# Altium footprint library NASCO 3D PCBLIB.PcbLib: 108 footprints (part 6 of 7)
Each footprint in its own frame and in the unit in brackets; x right, y up, seen from the top. Pads: shape width x height; smd on the part's side, far side on the other; paste and mask are expansions set on the pad; w line width, h text height; cw(c..) or ccw(c..) is an arc to the next point about the centre after c.
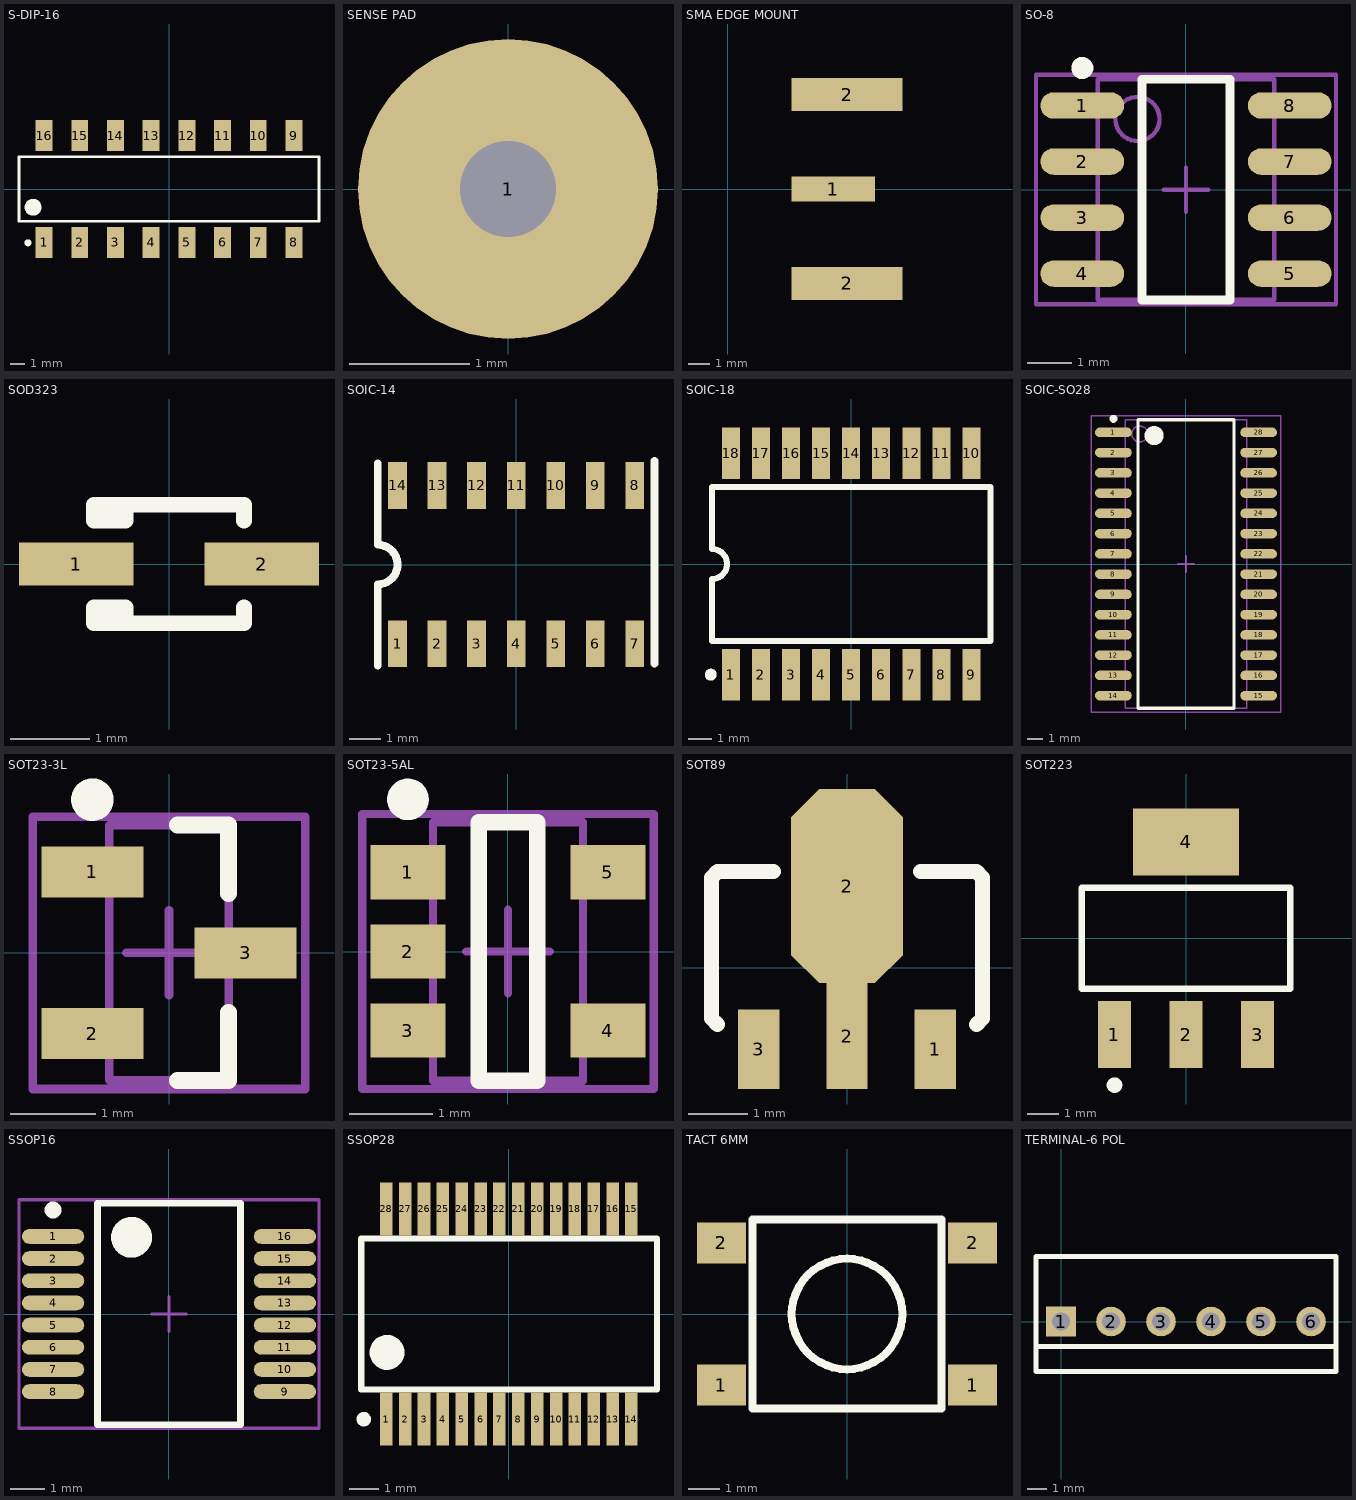
[diagram p5: the footprints below, top view; thin cyan lines are the x and y axes]

## S-DIP-16 [mm] "DIP; 16 Trim Leads; Row Spacing 7.62 mm; Pitch 2.54 mm"
height 5.58
pads (16):
  rect 1.2x2.2 smd: 1(-8.89,-3.8) 2(-6.35,-3.8) 3(-3.81,-3.8) 4(-1.27,-3.8) 5(1.27,-3.8) 6(3.81,-3.8) 7(6.35,-3.8) 8(8.89,-3.8) 9(8.89,3.8) 10(6.35,3.8) 11(3.81,3.8) 12(1.27,3.8) 13(-1.27,3.8) 14(-3.81,3.8) 15(-6.35,3.8) 16(-8.89,3.8)
Top Overlay:
  circle w0.6: c-9.675,-1.3 r0.3
  circle w0.25: c-10.04,-3.827 r0.125
  lines w0.2: -10.675,-2.3 -10.675,2.3 10.675,2.3 10.675,-2.3 -10.675,-2.3
3D body: height 4.4, standoff 0, extent -10.75,-4 10.75,4
3D body: height 5, standoff 0, extent -9.5,-1.75 -8.25,0
3D body: height 5, standoff 0, extent -6.96,-1.75 -5.71,0
3D body: height 5, standoff 0, extent -4.42,-1.75 -3.17,0
3D body: height 5, standoff 0, extent -1.88,-1.75 -0.63,0
3D body: height 5, standoff 0, extent 0.66,-1.75 1.91,0
3D body: height 5, standoff 0, extent 3.2,-1.75 4.45,0
3D body: height 5, standoff 0, extent 5.74,-1.75 6.99,0
3D body: height 5, standoff 0, extent 8.28,-1.75 9.53,0
3D body: height 4.41, standoff 0, extent -9.5,0 -8.25,1.5
3D body: height 4.41, standoff 0, extent -6.96,0 -5.71,1.5
3D body: height 4.41, standoff 0, extent -4.42,0 -3.17,1.5
3D body: height 4.41, standoff 0, extent -1.88,0 -0.63,1.5
3D body: height 4.41, standoff 0, extent 0.66,0 1.91,1.5
3D body: height 4.41, standoff 0, extent 3.2,0 4.45,1.5
3D body: height 4.41, standoff 0, extent 5.74,0 6.99,1.5
3D body: height 4.41, standoff 0, extent 8.28,0 9.53,1.5

## SENSE PAD [mm]
height 3.9
pads (1):
  round 2.5 hole 0.8 unplated: 1(0,0)

## SMA EDGE MOUNT [mil]
pads (3):
  rect 150x45 smd: 1(190,0)
  rect 200x60 smd: 2(215,-170) 2(215,170)
3D body "User Library-SMA_142-0701-851.step": height 161.23, standoff -150.58, extent -244.49,-187.4 300,187.4

## SO-8 [mm] "SOIC, 8-Leads, Body 4.9x3.9mm, Pitch 1.27mm, IPC High Density"
height 1.75
pads (8):
  oval 1.9x0.6 smd: 1(-2.35,1.905) 2(-2.35,0.635) 3(-2.35,-0.635) 4(-2.35,-1.905) 5(2.35,-1.905) 6(2.35,-0.635) 7(2.35,0.635) 8(2.35,1.905)
Top Overlay:
  circle w0.25: c-2.35,2.755 r0.125
  lines w0.2: -1,-2.5 -1,2.5 1,2.5 1,-2.5 -1,-2.5
Mechanical 13:
  circle w0.1: c-1.1,1.6 r0.5
  lines w0.1: -2,-2.5 -2,2.5 2,2.5 2,-2.5 -2,-2.5
Mechanical 15:
  lines w0.1: -0.5,0 0.5,0 ; 0,-0.5 0,0.5 ; -3.4,-2.6 -3.4,2.6 3.4,2.6 3.4,-2.6 -3.4,-2.6
3D body "User Library-SOIC-8-1.STEP": height 1.75, standoff 0, extent -2.9,-2.45 3.1,2.45

## SOD323 [mm] "SOD-323/SC-76; 2 Leads; Body 1.7 x 1.3 mm, (LxW)"
height 1.1
pads (2):
  rect 1.45x0.55 smd: 1(-1.175,0) 2(1.175,0)
Top Overlay:
  lines w0.2: -0.55,-0.75 -0.55,-0.55 -0.95,-0.55 -0.95,-0.75 0.95,-0.75 0.95,-0.55 ; -0.55,0.75 -0.55,0.55 -0.95,0.55 -0.95,0.75 0.95,0.75 0.95,0.55
3D body "User Library-SOD323.step": height 1.01, standoff 0.02, extent -1.25,-0.635 1.25,0.615

## SOIC-14 [mm] "SOIC-14  NARROW BODY"
pads (14):
  rect 0.6x1.5 smd: 1(-3.81,-2.54) 2(-2.54,-2.54) 3(-1.27,-2.54) 4(0,-2.54) 5(1.27,-2.54) 6(2.54,-2.54) 7(3.81,-2.54) 8(3.81,2.54) 9(2.54,2.54) 10(1.27,2.54) 11(0,2.54) 12(-1.27,2.54) 13(-2.54,2.54) 14(-3.81,2.54)
Top Overlay:
  lines w0.254: -4.445,-3.25 -4.445,-0.635 ccw(c-4.445,0) -4.445,0.635 -4.445,3.25 ; 4.445,-3.175 4.445,3.325
3D body "User Library-SOIC-14.step": height 1.75, standoff 0, extent -4.375,-3 4.375,3

## SOIC-18 [mil]
pads (18):
  rect 30x85 smd: 1(-200,-184.05) 2(-150,-184.05) 3(-100,-184.05) 4(-50,-184.05) 5(0,-184.05) 6(50,-184.05) 7(100,-184.05) 8(150,-184.05) 9(200,-184.05) 10(200,184.06) 11(150,184.06) 12(100,184.06) 13(50,184.06) 14(0,184.06) 15(-50,184.06) 16(-100,184.06) 17(-150,184.06) 18(-200,184.06)
Top Overlay:
  circle w10: c-233.46,-184.06 r4.92
  lines w10: -231.3,-127.95 -231.3,-25 ccw(c-231.3,0) -231.3,25 -231.3,127.95 231.3,127.95 231.3,-127.95 -231.3,-127.95
3D body: height 98.43, standoff 0, extent -236.22,-147.64 236.22,147.64
3D body: height 100.39, standoff 98.43, extent -196.85,-108.27 -157.64,-68.98

## SOIC-SO28 [mm] "SOIC, 28-Leads, Body 17.9x7.5mm, Pitch 1.27mm, IPC Medium Density"
height 2.65
pads (28):
  oval 2.3x0.6 smd: 1(-4.55,8.255) 2(-4.55,6.985) 3(-4.55,5.715) 4(-4.55,4.445) 5(-4.55,3.175) 6(-4.55,1.905) 7(-4.55,0.635) 8(-4.55,-0.635) 9(-4.55,-1.905) 10(-4.55,-3.175) 11(-4.55,-4.445) 12(-4.55,-5.715) 13(-4.55,-6.985) 14(-4.55,-8.255) 15(4.55,-8.255) 16(4.55,-6.985) 17(4.55,-5.715) 18(4.55,-4.445) 19(4.55,-3.175) 20(4.55,-1.905) 21(4.55,-0.635) 22(4.55,0.635) 23(4.55,1.905) 24(4.55,3.175) 25(4.55,4.445) 26(4.55,5.715) 27(4.55,6.985) 28(4.55,8.255)
Top Overlay:
  circle w0.25: c-4.55,9.105 r0.125
  circle w0.6: c-2,8.05 r0.3
  lines w0.2: -3,-9.05 -3,9.05 3,9.05 3,-9.05 -3,-9.05
Mechanical 13:
  circle w0.1: c-2.9,8.155 r0.5
  lines w0.1: -3.8,-9.055 -3.8,9.055 3.8,9.055 3.8,-9.055 -3.8,-9.055
Mechanical 15:
  lines w0.1: -0.5,0 0.5,0 ; 0,-0.5 0,0.5 ; -5.95,-9.3 -5.95,9.3 5.95,9.3 5.95,-9.3 -5.95,-9.3
3D body "User Library-28-SOIC.step": height 2.67, standoff -0.08, extent -5.22,-8.95 5.08,8.95

## SOT23-3L [mm] "SOT23, 3-Leads, Body 2.9x1.3mm, Pitch 0.95mm, Lead Span 2.5mm, IPC High Density"
height 1.1
pads (3):
  rect 1.2x0.6 smd: 1(-0.9,0.95) 2(-0.9,-0.95) 3(0.9,0)
Top Overlay:
  circle w0.25: c-0.9,1.8 r0.125
  lines w0.2: 0.1,-1.5 0.7,-1.5 0.7,-0.7 ; 0.1,1.5 0.7,1.5 0.7,0.7
Mechanical 13:
  lines w0.1: -0.7,-1.5 0.7,-1.5 0.7,1.5 -0.7,1.5 -0.7,-1.5
Mechanical 15:
  lines w0.1: -0.5,0 0.5,0 ; 0,-0.5 0,0.5 ; -1.6,-1.6 1.6,-1.6 1.6,1.6 -1.6,1.6 -1.6,-1.6
3D body "SW3DPS-SOT-23-DEFAULT.STEP": height 1.12, standoff 0.02, extent -1.25,-1.5 1.25,1.5

## SOT23-5AL [mm] "SOT23, 5-Leads, Body 2.9x1.6mm, Pitch 0.95mm, Lead Span 2.8mm, IPC High Density"
height 1.45
pads (5):
  rect 0.9x0.65 smd: 1(-1.2,0.95) 2(-1.2,0) 3(-1.2,-0.95) 4(1.2,-0.95) 5(1.2,0.95)
Top Overlay:
  circle w0.25: c-1.2,1.825 r0.125
  lines w0.2: -0.35,-1.55 -0.35,1.55 0.35,1.55 0.35,-1.55 -0.35,-1.55
Mechanical 13:
  lines w0.1: -0.9,-1.55 0.9,-1.55 0.9,1.55 -0.9,1.55 -0.9,-1.55
Mechanical 15:
  lines w0.1: -0.5,0 0.5,0 ; 0,-0.5 0,0.5 ; -1.75,-1.65 1.75,-1.65 1.75,1.65 -1.75,1.65 -1.75,-1.65
3D body "User Library-sot235.step": height 1, standoff 0, extent -1.17,-1.46 1.17,1.46

## SOT89 [mm]
height 1.016
pads (4):
  rect 0.7x1.35 smd: 1(1.5,-1.388) 3(-1.5,-1.388)
  rect 0.7x1.8 smd: 2(0,-1.163)
  oct 1.9x3.3 smd: 2(0,1.388)
Top Overlay:
  lines w0.254: -2.2,-0.967 -2.3,-0.867 -2.3,1.534 -2.2,1.633 -1.252,1.633 ; 1.252,1.633 2.2,1.633 2.3,1.534 2.3,-0.867 2.2,-0.967
3D body "SW3dPS-SOT89.STEP": height 1.62, standoff 0.02, extent -2.3,-1.905 2.3,2.345

## SOT223 [mm] "SOT-223/SC-73; 4 Leads; Body 6.7 x 7.3 mm, inc. leads (LxW max)"
height 1.7
pads (4):
  rect 1.05x2.15 smd: 1(-2.3,-3.1) 2(0,-3.1) 3(2.3,-3.1)
  rect 3.4x2.15 smd: 4(0,3.1)
Top Overlay:
  circle w0.25: c-2.3,-4.725 r0.125
  lines w0.2: -3.35,-1.625 -3.35,1.625 3.35,1.625 3.35,-1.625 -3.35,-1.625
3D body "User Library-SOT-223-1.step": height 1.67, standoff 0.02, extent -3.25,-3.5 3.25,3.5

## SSOP16 [mm] "SOP, 16-Leads, Body 6.2x5.3mm, Pitch 0.65mm, IPC High Density"
height 2
pads (16):
  oval 1.829x0.432 smd: 1(-3.4,2.275) 2(-3.4,1.625) 3(-3.4,0.975) 4(-3.4,0.325) 5(-3.4,-0.325) 6(-3.4,-0.975) 7(-3.4,-1.625) 8(-3.4,-2.275) 9(3.4,-2.275) 10(3.4,-1.625) 11(3.4,-0.975) 12(3.4,-0.325) 13(3.4,0.325) 14(3.4,0.975) 15(3.4,1.625) 16(3.4,2.275)
Top Overlay:
  circle w0.6: c-1.1,2.25 r0.3
  circle w0.25: c-3.4,3.05 r0.125
  lines w0.2: -2.1,-3.25 2.1,-3.25 2.1,3.25 -2.1,3.25 -2.1,-3.25
Mechanical 15:
  lines w0.1: -0.5,0 0.5,0 ; 0,-0.5 0,0.5 ; -4.4,-3.35 4.4,-3.35 4.4,3.35 -4.4,3.35 -4.4,-3.35
3D body "SW3dPS-ssop-16 pos.STEP": height 2, standoff 0.02, extent -3.95,-3.162 3.95,3.162

## SSOP28 [mil]
pads (28):
  rect 17x72 smd: 1(-166.34,-142.72) 2(-140.75,-142.72) 3(-115.16,-142.72) 4(-89.57,-142.72) 5(-63.98,-142.72) 6(-38.39,-142.72) 7(-12.79,-142.72) 8(12.8,-142.72) 9(38.38,-142.72) 10(63.97,-142.72) 11(89.56,-142.72) 12(115.15,-142.72) 13(140.74,-142.72) 14(166.33,-142.72) 15(166.33,142.72) 16(140.74,142.72) 17(115.15,142.72) 18(89.56,142.72) 19(63.97,142.72) 20(38.38,142.72) 21(12.8,142.72) 22(-12.79,142.72) 23(-38.39,142.72) 24(-63.98,142.72) 25(-89.57,142.72) 26(-115.16,142.72) 27(-140.75,142.72) 28(-166.34,142.72)
Top Overlay:
  circle w23.62: c-165.35,-52.17 r11.81
  circle w9.84: c-196.85,-142.72 r4.92
  rectangle: -204.72,-102.36 -200,102.36
  lines w8: -200.79,-102.36 200.78,-102.36 200.78,102.36 -200.79,102.36 ; -200,-102.36 -200,102.36
3D body "User Library-SSOP-28-1.step": height 84.65, standoff 0, extent -203.35,-152.67 203.35,152.68

## TACT 6MM [mm]
pads (4):
  rect 1.55x1.3 smd: 1(-3.975,-2.25) 1(3.975,-2.25) 2(-3.975,2.25) 2(3.975,2.25)
Top Overlay:
  circle w0.254: c0,0 r1.75
  lines w0.254: -3,0 -3,-3 ; -3,-3 3,-3 3,3 -3,3 -3,-3
3D body: height 5, standoff 0, extent -1.75,-1.755 1.736,1.738
3D body: height 4, standoff 3, extent 1.5,1.505 2.495,2.501
3D body: height 4, standoff 3, extent 1.505,-2.496 2.5,-1.5
3D body: height 4, standoff 3, extent -2.496,-2.5 -1.501,-1.504
3D body: height 4, standoff 3, extent -2.5,1.5 -1.505,2.496
3D body: height 3.6, standoff 3.5, extent -3,-3 3,3
3D body: height 3.5, standoff 0, extent -3,-3 3,3

## TERMINAL-6 POL [mm]
pads (6):
  rect 1.5x1.5 hole 0.9: 1(0,0)
  round 1.5 hole 0.9: 2(2.54,0) 3(5.08,0) 4(7.62,0) 5(10.16,0) 6(12.7,0)
Top Overlay:
  lines w0.254: 13.97,1.016 13.97,3.302 -1.27,3.302 -1.27,1.27 ; 13.97,1.27 13.97,-1.27 ; -1.27,1.27 -1.27,-1.27 13.97,-1.27 ; -1.27,1.27 -1.27,-2.54 13.97,-2.54 13.97,-1.27
3D body "c-640454-6-y-3d.stp": height 9.99, standoff -3.6, extent -1.252,-3.192 13.988,3.285